# Altium integrated library Library AL.IntLib: 511 symbols (part 3 of 4) (continued)
## RS485 SN65HVD32 (continued)
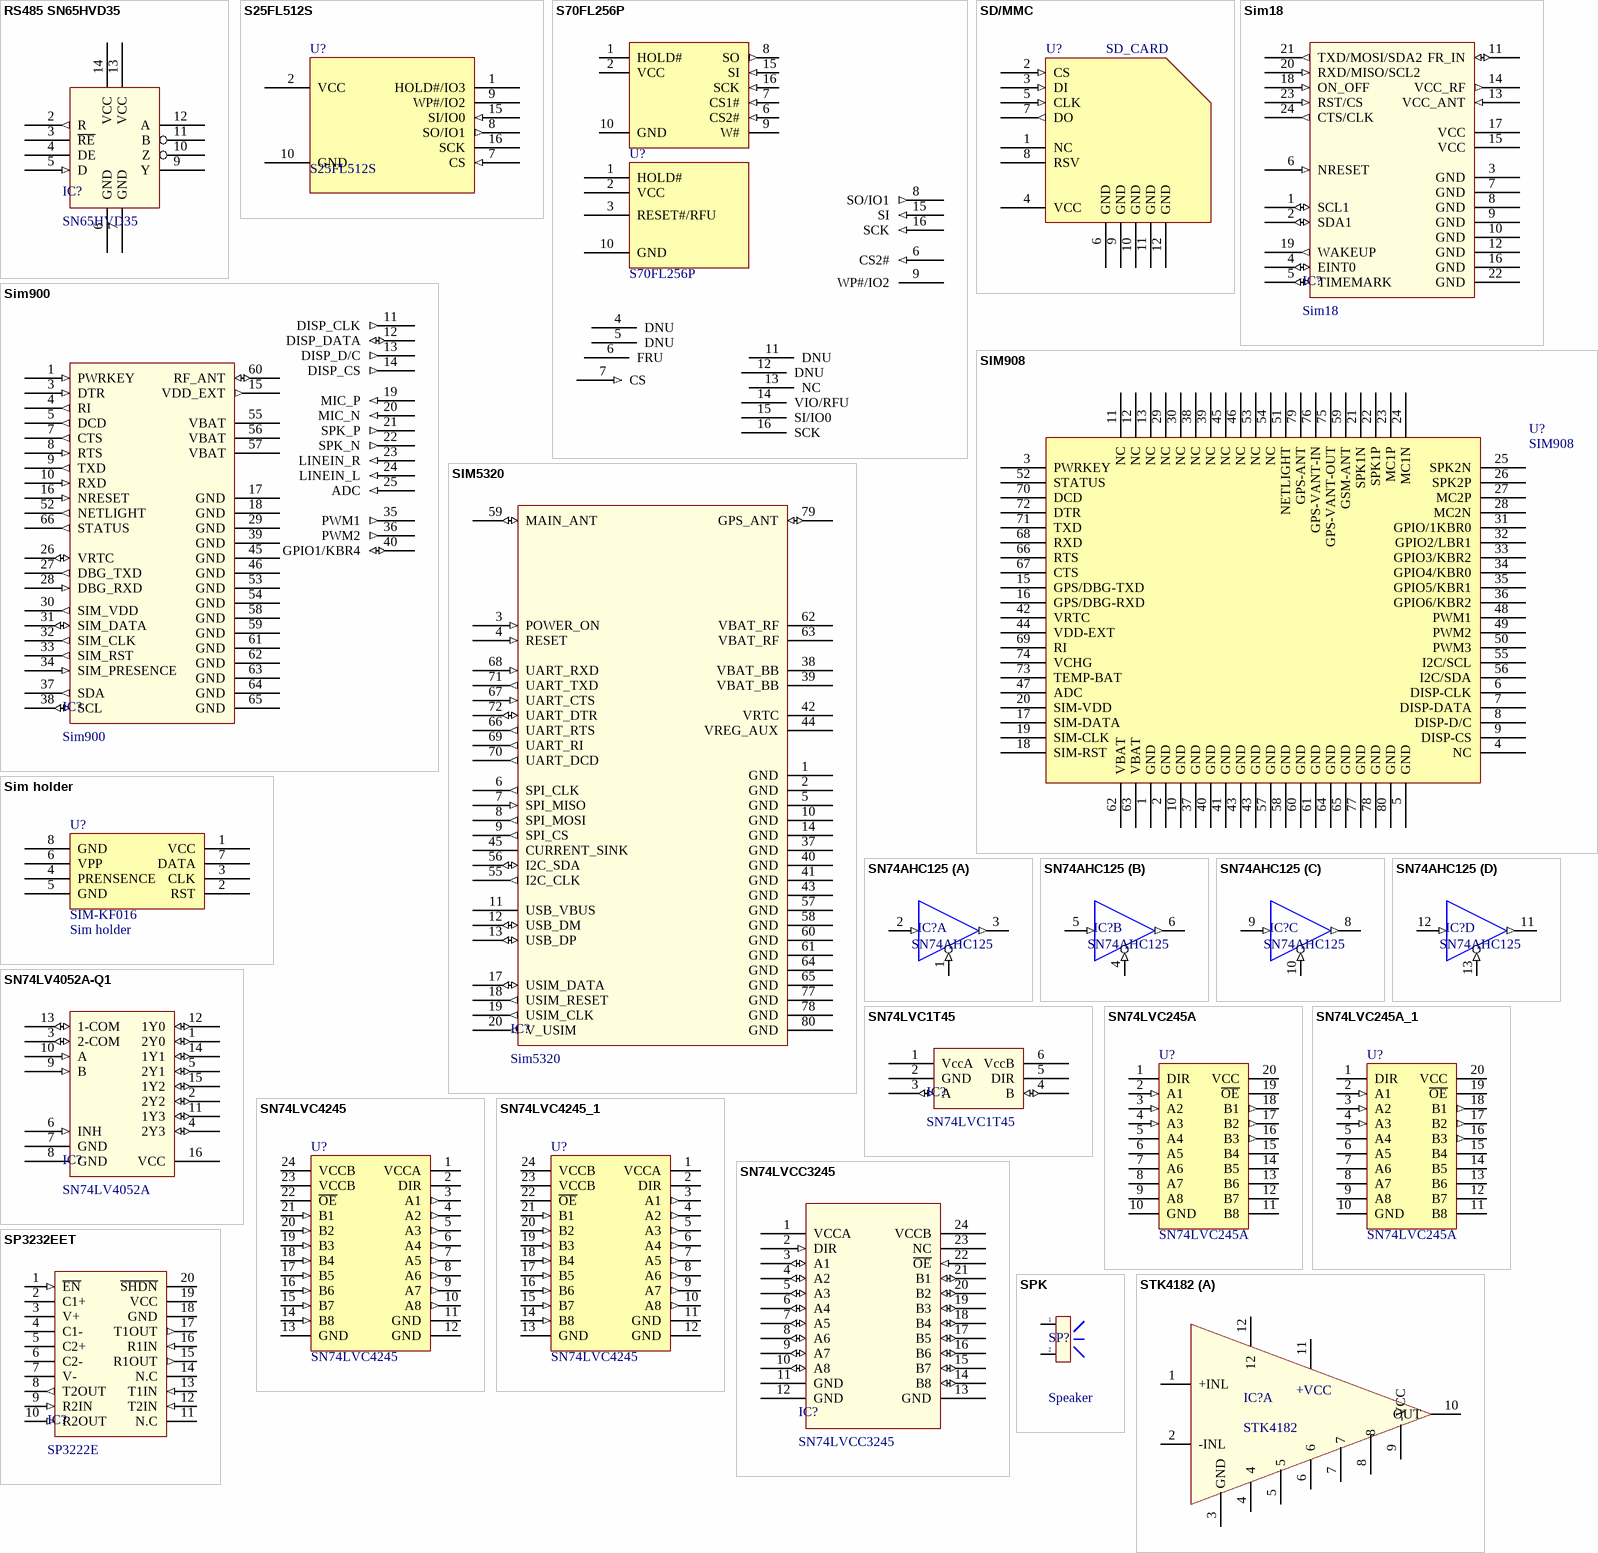
[diagram p17: symbols RS485 SN65HVD35 to STK4182]

## RS485 SN65HVD35
designator IC?, comment SN65HVD35
3.3 V Full-Duplex RS 485 Drivers and Receivers; SN65HVD35: Value
footprint SO-14 (SOIC, 14-Leads, Body 9.9x3.9mm, Pitch 1.27mm, IPC Medium Density)
pins: 1 NC hidden, 2 R (out), 3 ~{RE}, 4 DE, 5 D (in), 6 GND, 7 GND, 8 NC hidden, 9 Y, 10 Z, 11 B, 12 A, 13 VCC, 14 VCC

## S25FL512S
designator U?
S25FL512S 512 Mbit (64 Mbyte)
footprint SL3016 (SOIC, 16-Leads, Body 10.3x7.5mm (max), Pitch 1.27mm, IPC Medium Density)
pins: 1 HOLD#/IO3, 2 VCC (power), 3 RESET#/RFU hidden, 4 DNU hidden, 5 DNU hidden, 6 FRU hidden, 7 CS (in), 8 SO/IO1 (out), 9 WP#/IO2, 10 GND (power), 11 DNU hidden, 12 DNU hidden, 13 NC hidden, 14 VIO/RFU hidden, 15 SI/IO0 (in), 16 SCK

## S70FL256P
designator U?
S70FL256P0XMFI001
footprint SL3016 (SOIC, 16-Leads, Body 10.3x7.5mm (max), Pitch 1.27mm, IPC Medium Density)
pins: 1 HOLD#, 1 HOLD#, 2 VCC (power), 2 VCC (power), 3 RESET#/RFU, 4 DNU, 5 DNU, 6 CS2# (in), 6 FRU, 6 CS2# (in), 7 CS (in), 7 CS1# (in), 8 SO/IO1 (out), 8 SO (out), 9 WP#/IO2, 9 W#, 10 GND (power), 10 GND (power), 11 DNU, 12 DNU, 13 NC, 14 VIO/RFU, 15 SI (in), 15 SI/IO0, 15 SI (in), 16 SCK (in), 16 SCK, 16 SCK (in)

## SD/MMC
designator U?, comment SD_CARD
SD/MMC holder; Name: SD/MMC; Price: 10000
footprint SD
pins: 1 NC, 2 CS (in), 3 DI (in), 4 VCC, 5 CLK (in), 6 GND, 7 DO (out), 8 RSV, 9 GND, 10 GND, 11 GND, 12 GND

## Sim18
designator IC?
GPS Module
footprint Sim18
pins: 1 SCL1 (io), 2 SDA1 (io), 3 GND (power), 4 EINT0 (io), 5 TIMEMARK (io), 6 NRESET (in), 7 GND (power), 8 GND (power), 9 GND (power), 10 GND (power), 11 FR_IN (io), 12 GND (power), 13 VCC_ANT (in), 14 VCC_RF (out), 15 VCC (power), 16 GND (power), 17 VCC (power), 18 ON_OFF (in), 19 WAKEUP (out), 20 RXD/MISO/SCL2 (in), 21 TXD/MOSI/SDA2 (out), 22 GND (power), 23 RST/CS (in), 24 CTS/CLK (out)

## Sim900
designator IC?
GSM GPRS Module
footprint Sim900 (Sim900,QFN, 68-Leads, Body 24,0x24,0mm (max), Pitch 1,00mm, IPC Medium Density)
pins: 1 PWRKEY (in), 2 NC hidden, 3 DTR (in), 4 RI (out), 5 DCD (out), 6 NC hidden, 7 CTS (out), 8 RTS (in), 9 TXD (out), 10 RXD (in), 11 DISP_CLK (out), 12 DISP_DATA (io), 13 DISP_D/C (out), 14 DISP_CS (out), 15 VDD_EXT (out), 16 NRESET (in), 17 GND (power), 18 GND (power), 19 MIC_P (in), 20 MIC_N (in), 21 SPK_P (out), 22 SPK_N (out), 23 LINEIN_R (in), 24 LINEIN_L (in), 25 ADC (in), 26 VRTC (io), 27 DBG_TXD (out), 28 DBG_RXD (in), 29 GND (power), 30 SIM_VDD (out), 31 SIM_DATA (io), 32 SIM_CLK (out), 33 SIM_RST (out), 34 SIM_PRESENCE (in), 35 PWM1 (out), 36 PWM2 (out), 37 SDA (out), 38 SCL (io), 39 GND (power), 40 GPIO1/KBR4 (io), 41 GPIO2/KBR3 (io) hidden, 42 GPIO3/KPR2 (io) hidden, 43 GPIO4/KPR1 (io) hidden, 44 GPIO5/KPR0 (io) hidden, 45 GND (power), 46 GND (power), 47 GPIO6/KPC4 (io) hidden, 48 GPIO7/KBC3 (io) hidden, 49 GPIO8/KBC2 (io) hidden, 50 GPIO9/KBC1 (io) hidden, 51 GPIO10 (io) hidden, 52 NETLIGHT (out), 53 GND (power), 54 GND (power), 55 VBAT (power), 56 VBAT (power), 57 VBAT (power), 58 GND (power), 59 GND (power), 60 RF_ANT (io), 61 GND (power), 62 GND (power), 63 GND (power), 64 GND (power), 65 GND (power), 66 STATUS (out), 67 GPIO11 (out) hidden, 68 GPIO12 (out) hidden

## SIM908
designator U?
SIM908 GSM/GPRS + GPS module
footprint Sim 908 (Sim 908 GPRS-GPS)
pins: 1 GND, 2 GND, 3 PWRKEY, 4 NC, 5 GND, 6 DISP-CLK, 7 DISP-DATA, 8 DISP-D/C, 9 DISP-CS, 10 GND, 11 NC, 12 NC, 13 NC, 15 GPS/DBG-TXD, 16 GPS/DBG-RXD, 17 SIM-DATA, 18 SIM-RST, 19 SIM-CLK, 20 SIM-VDD, 21 SPK1N, 22 SPK1P, 23 MC1P, 24 MC1N, 25 SPK2N, 26 SPK2P, 27 MC2P, 28 MC2N, 29 NC, 30 NC, 31 GPIO/1KBR0, 32 GPIO2/LBR1, 33 GPIO3/KBR2, 34 GPIO4/KBR0, 35 GPIO5/KBR1, 36 GPIO6/KBR2, 37 GND, 38 NC, 39 NC, 40 GND, 41 GND, 42 VRTC, 43 GND, 43 GND, 44 VDD-EXT, 45 NC, 46 NC, 47 ADC, 48 PWM1, 49 PWM2, 50 PWM3, 51 NETLIGHT, 52 STATUS, 53 NC, 54 NC, 55 I2C/SCL, 56 I2C/SDA, 57 GND, 58 GND, 59 GSM-ANT, 60 GND, 61 GND, 62 VBAT, 63 VBAT, 64 GND, 65 GND, 66 RTS, 67 CTS, 68 RXD, 69 RI, 70 DCD, 71 TXD, 72 DTR, 73 TEMP-BAT, 74 VCHG, 75 GPS-VANT-OUT, 76 GPS-VANT-IN, 77 GND, 78 GND, 79 GPS-ANT, 80 GND

## SIM5320
designator IC?, comment Sim5320
SIM5320 GSM/GPRS/WCDMA/GPS
pins: 1 GND, 2 GND, 3 POWER_ON (in), 4 RESET (in), 5 GND, 6 SPI_CLK (out), 7 SPI_MISO (in), 8 SPI_MOSI (out), 9 SPI_CS (out), 10 GND, 11 USB_VBUS, 12 USB_DM (io), 13 USB_DP (io), 14 GND, 15 RESERVED hidden, 16 RESERVED hidden, 17 USIM_DATA (io), 18 USIM_RESET (out), 19 USIM_CLK (out), 20 V_USIM (out), 21 SPK_M hidden, 22 SPK_P hidden, 23 MIC1P hidden, 24 MIC1N hidden, 25 EAR1N hidden, 26 EAR1P hidden, 27 KEYSENSE_N1 hidden, 28 KEYSENSE_N0 hidden, 29 KEYPAD_0 hidden, 30 KEYPAD_2 hidden, 31 KEYSENSE_N2 hidden, 32 KEYSENSE_N3 hidden, 33 KEYPAD_1 hidden, 34 KEYPAD_4 hidden, 35 KEYPAD_3 hidden, 36 KEYSENSE_N4 hidden, 37 GND, 38 VBAT_BB, 39 VBAT_BB, 40 GND, 41 GND, 42 VRTC, 43 GND, 44 VREG_AUX, 45 CURRENT_SINK, 46 ADC2 hidden, 47 ADC1 hidden, 48 GPIO44 hidden, 49 GPIO40 hidden, 50 GPIO43 hidden, 51 GPIO1 hidden, 52 GPIO41 hidden, 53 GPIO42 hidden, 54 GPIO4 hidden, 55 I2C_CLK (out), 56 I2C_SDA (io), 57 GND, 58 GND, 59 MAIN_ANT (io), 60 GND, 61 GND, 62 VBAT_RF, 63 VBAT_RF, 64 GND, 65 GND, 66 UART_RTS (out), 67 UART_CTS (in), 68 UART_RXD (in), 69 UART_RI (out), 70 UART_DCD (out), 71 UART_TXD (out), 72 UART_DTR (io), 73 PCM_DOUT hidden, 74 PCM_DIN hidden, 75 PCM_SYNC hidden, 76 PCM_CLK hidden, 77 GND, 78 GND, 79 GPS_ANT (io), 80 GND

## Sim holder
designator U?, comment SIM-KF016  value Sim holder
SIM Card Holder KF-016
footprint SIM_HOLDER
pins: 1 VCC, 2 RST, 3 CLK, 4 PRENSENCE, 5 GND, 6 VPP, 7 DATA, 8 GND

## SN74AHC125
designator IC?
QUADRUPLE BUS BUFFER GATES  WITH 3-STATE OUTPUTS
pins on every part: 7 GND (power) hidden to GND, 14 VCC (power) hidden to VCC
part A pins: 1 1~{OE} (in), 2 1A (in), 3 1Y (out)
part B pins: 4 2~{OE} (in), 5 2A (in), 6 2Y (out)
part C pins: 8 3Y (out), 9 3A (in), 10 3~{OE} (in)
part D pins: 11 4Y (out), 12 4A (in), 13 4~{OE} (in)

## SN74LV4052A-Q1
designator IC?, comment SN74LV4052A
DUAL 4-CHANNEL ANALOG MULTIPLEXERS/DEMULTIPLEXERS
pins: 1 2Y0 (io), 2 2Y2 (io), 3 2-COM (io), 4 2Y3 (io), 5 2Y1 (io), 6 INH (in), 7 GND (power), 8 GND (power), 9 B (in), 10 A (in), 11 1Y3 (io), 12 1Y0 (io), 13 1-COM (io), 14 1Y1 (io), 15 1Y2 (io), 16 VCC (power)

## SN74LVC1T45
designator IC?
SINGLE-BIT DUAL-SUPPLY BUS TRANSCEIVER
footprint SOT23-6 (SOT23, 5-Leads, Body 3.0x3.0mm (max), Pitch 0.95mm, IPC Medium Density)
pins: 1 VccA, 2 GND, 3 A (io), 4 B (io), 5 DIR, 6 VccB

## SN74LVC245A
designator U?
footprint SOIC-20 (SOIC, 16-Leads, Body 10.3x7.5mm (max), Pitch 1.27mm, IPC Medium Density)
pins: 1 DIR, 2 A1 (in), 3 A2 (in), 4 A3 (in), 5 A4, 6 A5, 7 A6, 8 A7, 9 A8, 10 GND, 11 B8, 12 B7, 13 B6, 14 B5, 15 B4, 16 B3 (out), 17 B2 (out), 18 B1 (out), 19 ~{OE}, 20 VCC

## SN74LVC245A_1
designator U?, comment SN74LVC245A
footprint SOIC-20 (SOIC, 16-Leads, Body 10.3x7.5mm (max), Pitch 1.27mm, IPC Medium Density)
pins: 1 DIR, 2 A1 (in), 3 A2 (in), 4 A3 (in), 5 A4, 6 A5, 7 A6, 8 A7, 9 A8, 10 GND, 11 B8, 12 B7, 13 B6, 14 B5, 15 B4, 16 B3 (out), 17 B2 (out), 18 B1 (out), 19 ~{OE}, 20 VCC

## SN74LVC4245
designator U?
IC d¸n SN74LVC4245ADBR
footprint SSOP-24 (SOP, 24-Leads, Body 8.5x5.6mm (max), Pitch 0.65mm, IPC Medium Density)
pins: 1 VCCA, 2 DIR, 3 A1 (out), 4 A2 (out), 5 A3 (out), 6 A4 (out), 7 A5 (out), 8 A6 (out), 9 A7 (out), 10 A8 (out), 11 GND, 12 GND, 13 GND, 14 B8 (in), 15 B7 (in), 16 B6 (in), 17 B5 (in), 18 B4 (in), 19 B3 (in), 20 B2 (in), 21 B1 (in), 22 ~{OE}, 23 VCCB, 24 VCCB

## SN74LVC4245_1
designator U?, comment SN74LVC4245
IC d¸n SN74LVC4245ADBR
footprint SSOP-24 (SOP, 24-Leads, Body 8.5x5.6mm (max), Pitch 0.65mm, IPC Medium Density)
pins: 1 VCCA, 2 DIR, 3 A1 (out), 4 A2 (out), 5 A3 (out), 6 A4 (out), 7 A5 (out), 8 A6 (out), 9 A7 (out), 10 A8 (out), 11 GND, 12 GND, 13 GND, 14 B8 (in), 15 B7 (in), 16 B6 (in), 17 B5 (in), 18 B4 (in), 19 B3 (in), 20 B2 (in), 21 B1 (in), 22 ~{OE}, 23 VCCB, 24 VCCB

## SN74LVCC3245
designator IC?
OCTAL BUS TRANSCEIVER  WITH ADJUSTABLE OUTPUT VOLTAGE AND 3-STATE OUTPUTS
pins: 1 VCCA (power), 2 DIR (in), 3 A1 (io), 4 A2 (io), 5 A3 (io), 6 A4 (io), 7 A5 (io), 8 A6 (io), 9 A7 (io), 10 A8 (io), 11 GND (power), 12 GND (power), 13 GND (power), 14 B8 (io), 15 B7 (io), 16 B6 (io), 17 B5 (io), 18 B4 (io), 19 B3 (io), 20 B2 (io), 21 B1 (io), 22 ~{OE} (in), 23 NC, 24 VCCB (power)

## SP3232EET
designator IC?, comment SP3222E
True +3.0V to +5.5V RS-232 Transceivers
pins: 1 ~{EN} (in), 2 C1+, 3 V+, 4 C1-, 5 C2+, 6 C2-, 7 V-, 8 T2OUT (out), 9 R2IN (in), 10 R2OUT (in), 11 N.C, 12 T2IN (in), 13 T1IN (in), 14 N.C, 15 R1OUT (out), 16 R1IN (in), 17 T1OUT (out), 18 GND (power), 19 VCC (power), 20 ~{SHDN}

## SPK
designator SP?, comment Speaker
Speaker Chip; Value: Speaker Chip
footprint SPK (Speaker Chip)
footprint SP1 (Speaker Telphone on Broad)
pins: 1, 2

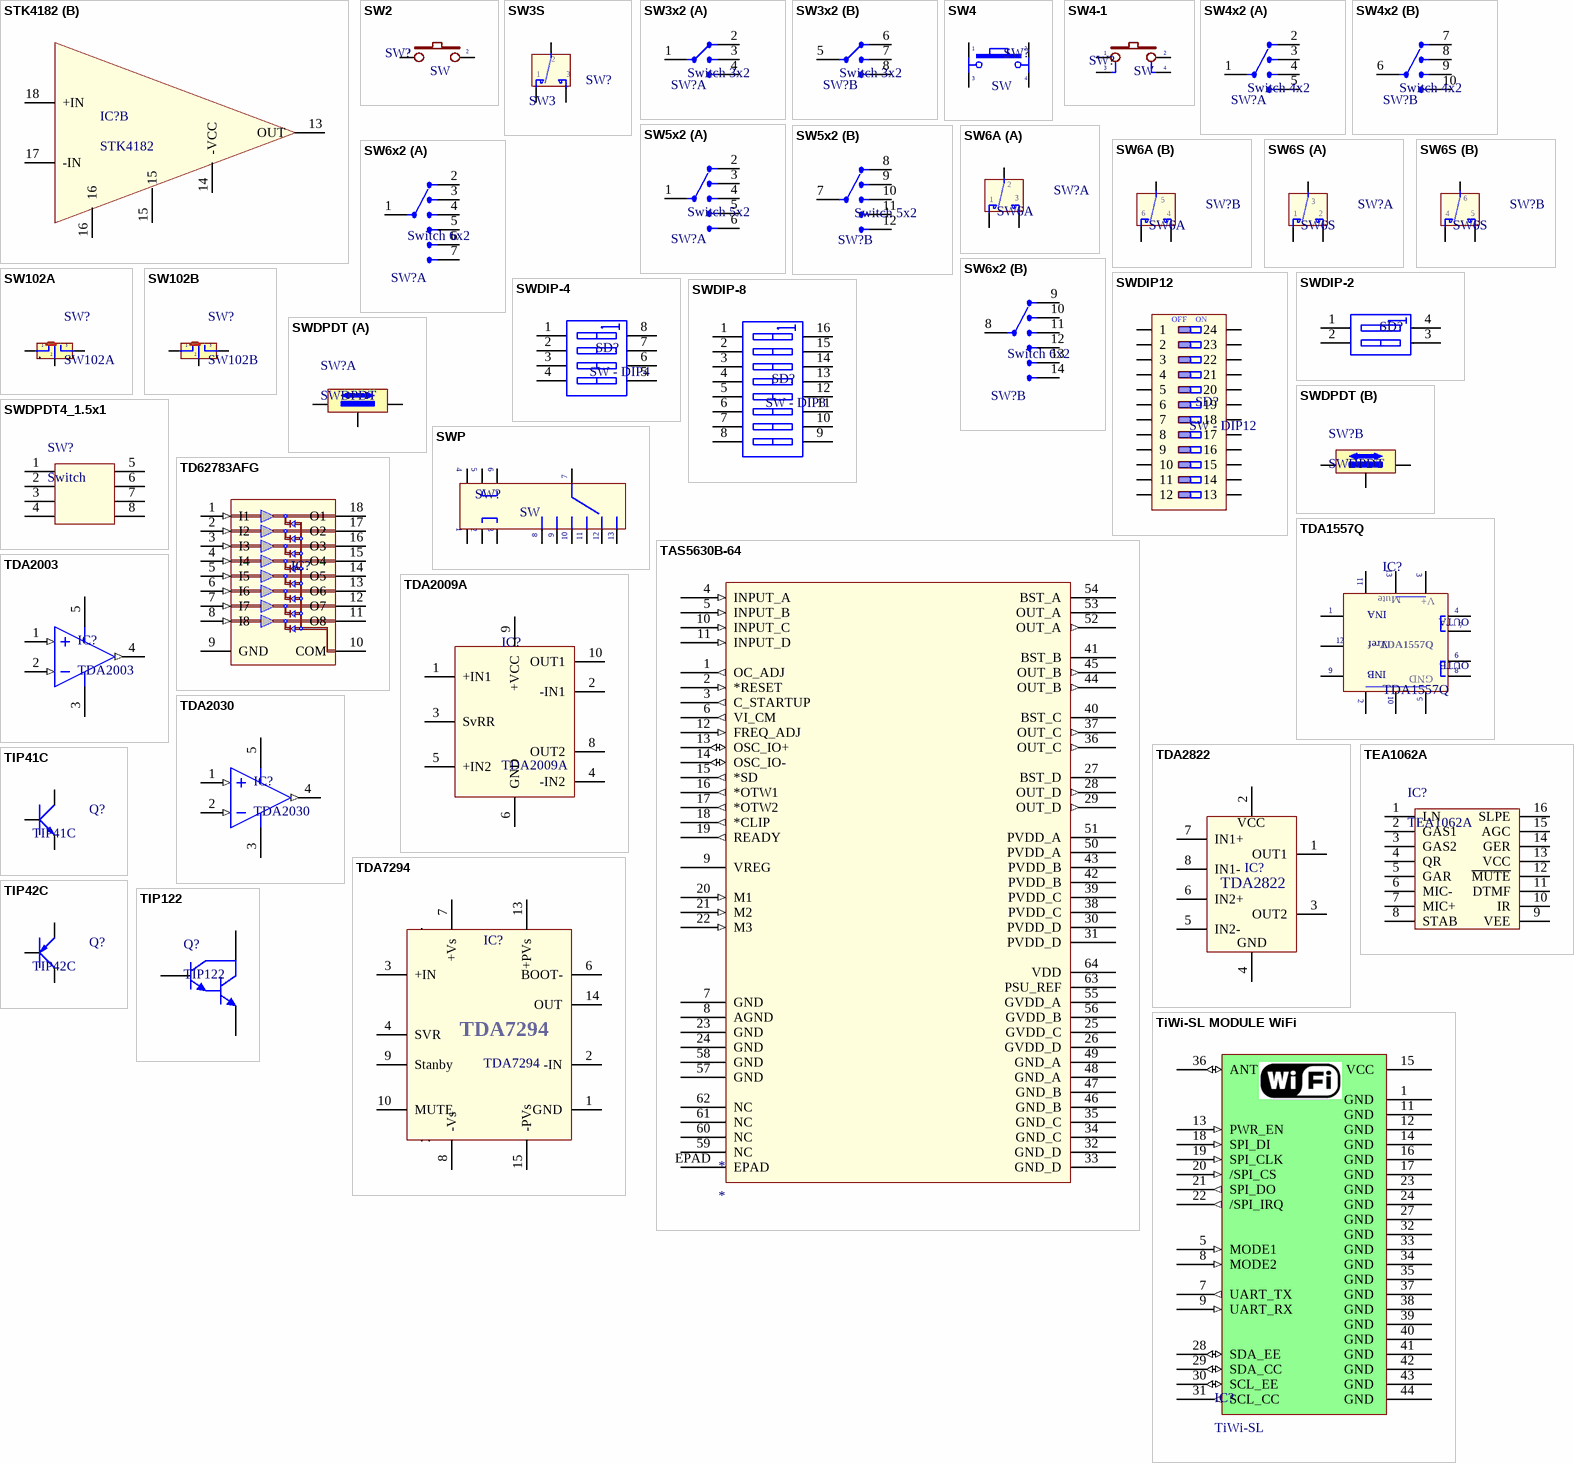
[diagram p18: symbols STK4182 to TiWi-SL MODULE WiFi]

## STK4182
designator IC?
AF Power Amplifier 2x10W
footprint STK4182 (Pin to pin 100mil, 18 pin)
part A pins: 1 +INL, 2 -INL, 3 GND, 4, 5, 6, 7, 8, 9 -VCC, 10 OUT, 11 +VCC, 12
part B pins: 13 OUT, 14 -VCC, 15, 16, 17 -IN, 18 +IN

## SW2
designator SW?, comment SW
Switch button 2 pin; Value: SW chip 2 pin
footprint SW2 (SW button 2pin, 250x 250 mil)
footprint SW2-D1 (Footprint not found)
footprint SW2-D2 (Footprint not found)
pins: 1, 2

## SW3S
designator SW?, comment SW3
SW-DTDP - 3Pin; Value: SW6
pins: 1, 2, 3

## SW3x2
designator SW?, comment Switch 3x2
Value: Switch 4x2
footprint SW3X2 (Switch 3x2 - pin to pin 80)
part A pins: 1 Com, 2 I/O1, 3 I/O2, 4 I/O3
part B pins: 5 I/O10, 6 I/O9, 7 Com2, 8 I/O6

## SW4
designator SW?, comment SW
Switch button 4 pin; Value: Button chip 4 pin
footprint SW4 (SW button 4pin, 250 x250 mil)
footprint SW4B (SW button 4pin, 450 x 450 mil)
pins: 1, 2, 3, 4

## SW4-1
designator SW?, comment SW
Switch button 4 pin; Value: SW chip 4 pin
footprint SW4 (SW button 4pin, 250 x250 mil)
footprint SW4B (SW button 4pin, 450 x 450 mil)
pins: 1, 2, 3, 4

## SW4x2
designator SW?, comment Switch 4x2
Value: Switch 4x2
footprint SW4X2 (Switch 4x2)
part A pins: 1 Com, 2 I/O1, 3 I/O2, 4 I/O3, 5 I/O4
part B pins: 6 I/O9, 7 Com2, 8 I/O6, 9 I/O7, 10 I/O8

## SW5x2
designator SW?, comment Switch 5x2
Value: Switch 5x2
footprint SW5X2 (Switch 5x2)
part A pins: 1 Com, 2 I/O1, 3 I/O2, 4 I/O3, 5 I/O4, 6 I/O5
part B pins: 7 Com2, 8 I/O6, 9 I/O7, 10 I/O8, 11 I/O9, 12 I/O10

## SW6A
designator SW?
SW-DTDP - 6 Pin; Value: SW6
footprint SW6 (SW DTDP - 6Pin 260x300x300 mil)
part A pins: 1, 2, 3
part B pins: 4, 5, 6

## SW6S
designator SW?
SW-DTDP - 6 Pin; Value: SW6
footprint SW6 (SW DTDP - 6Pin 260x300x300 mil)
part A pins: 1, 2, 3
part B pins: 4, 5, 6

## SW6x2
designator SW?, comment Switch 6x2
Value: Switch 6x2
footprint SW6X2 (Switch 6x2)
part A pins: 1 Com, 2 I/O1, 3 I/O2, 4 I/O3, 5 I/O4, 6 I/O5, 7 I/O6
part B pins: 8 I/O6, 9 I/O7, 10 I/O8, 11 I/O9, 12 I/O10, 13 I/O11, 14 I/O12

## SW102A
designator SW?
Switch 102 on Broad; Value: Switch 102 On Board
footprint SW102 (Switch 102 On Board nho)
footprint SW102T (Switch 102 On Board To)
pins: 1, 2, 3, 4, 5

## SW102B
designator SW?
Switch 102 on Broad; Value: Switch 102 On Board
footprint SW-GAT
footprint SW102T (Switch 102 On Board To)
pins: 1, 2, 3

## SWDIP12
designator SD?, comment SW - DIP12
DIP Switch, 12 Position, SPST; Value: SW - DIP12
footprint DIP24/W0.3 (DIP24/W.300, Pin to pin 100mil)
pins: 1, 2, 3, 4, 5, 6, 7, 8, 9, 10, 11, 12, 13, 14, 15, 16, 17, 18, 19, 20, 21, 22, 23, 24
text: OFF; ON

## SWDIP-2
designator SD?, comment SW - DIP2  (value not drawn)
DIP Switch, 2 Position, SPST; Value: SW - DIP2
footprint DIP4/W0.3 KEY (4 PIN, W 400mil , L 450mil,Pin to pin 100mil)
pins: 1 A1, 2 A2, 3 A3, 4 A4

## SWDIP-4
designator SD?, comment SW - DIP4
DIP Switch, 4 Position, SPST; Value: SW - DIP4
footprint DIP8/W0.3 KEY (8 PIN, W 400mil , L 450mil, Pin to pin 100mil)
pins: 1 A1, 2 A2, 3 A3, 4 A4, 5 B4, 6 B3, 7 B2, 8 B1

## SWDIP-8
designator SD?, comment SW - DIP8
DIP Switch, 8 Position, SPST; Value: SW - DIP8
footprint DIP16/W0.3 KEY (16 PIN, W 300mil, Pin to pin 100mil)
simulation model dpsw8 (Spice Subcircuit)
pins: 1 A1, 2 A2, 3 A3, 4 A4, 5 A5, 6 A6, 7 A7, 8 A8, 9 B8, 10 B7, 11 B6, 12 B5, 13 B4, 14 B3, 15 B2, 16 B1
